# Altium footprint library th.PcbLib: 51 footprints (part 1 of 4)
Each footprint in its own frame and in the unit in brackets; x right, y up, seen from the top. Pads: shape width x height; smd on the part's side, far side on the other; paste and mask are expansions set on the pad; w line width, h text height; cw(c..) or ccw(c..) is an arc to the next point about the centre after c.
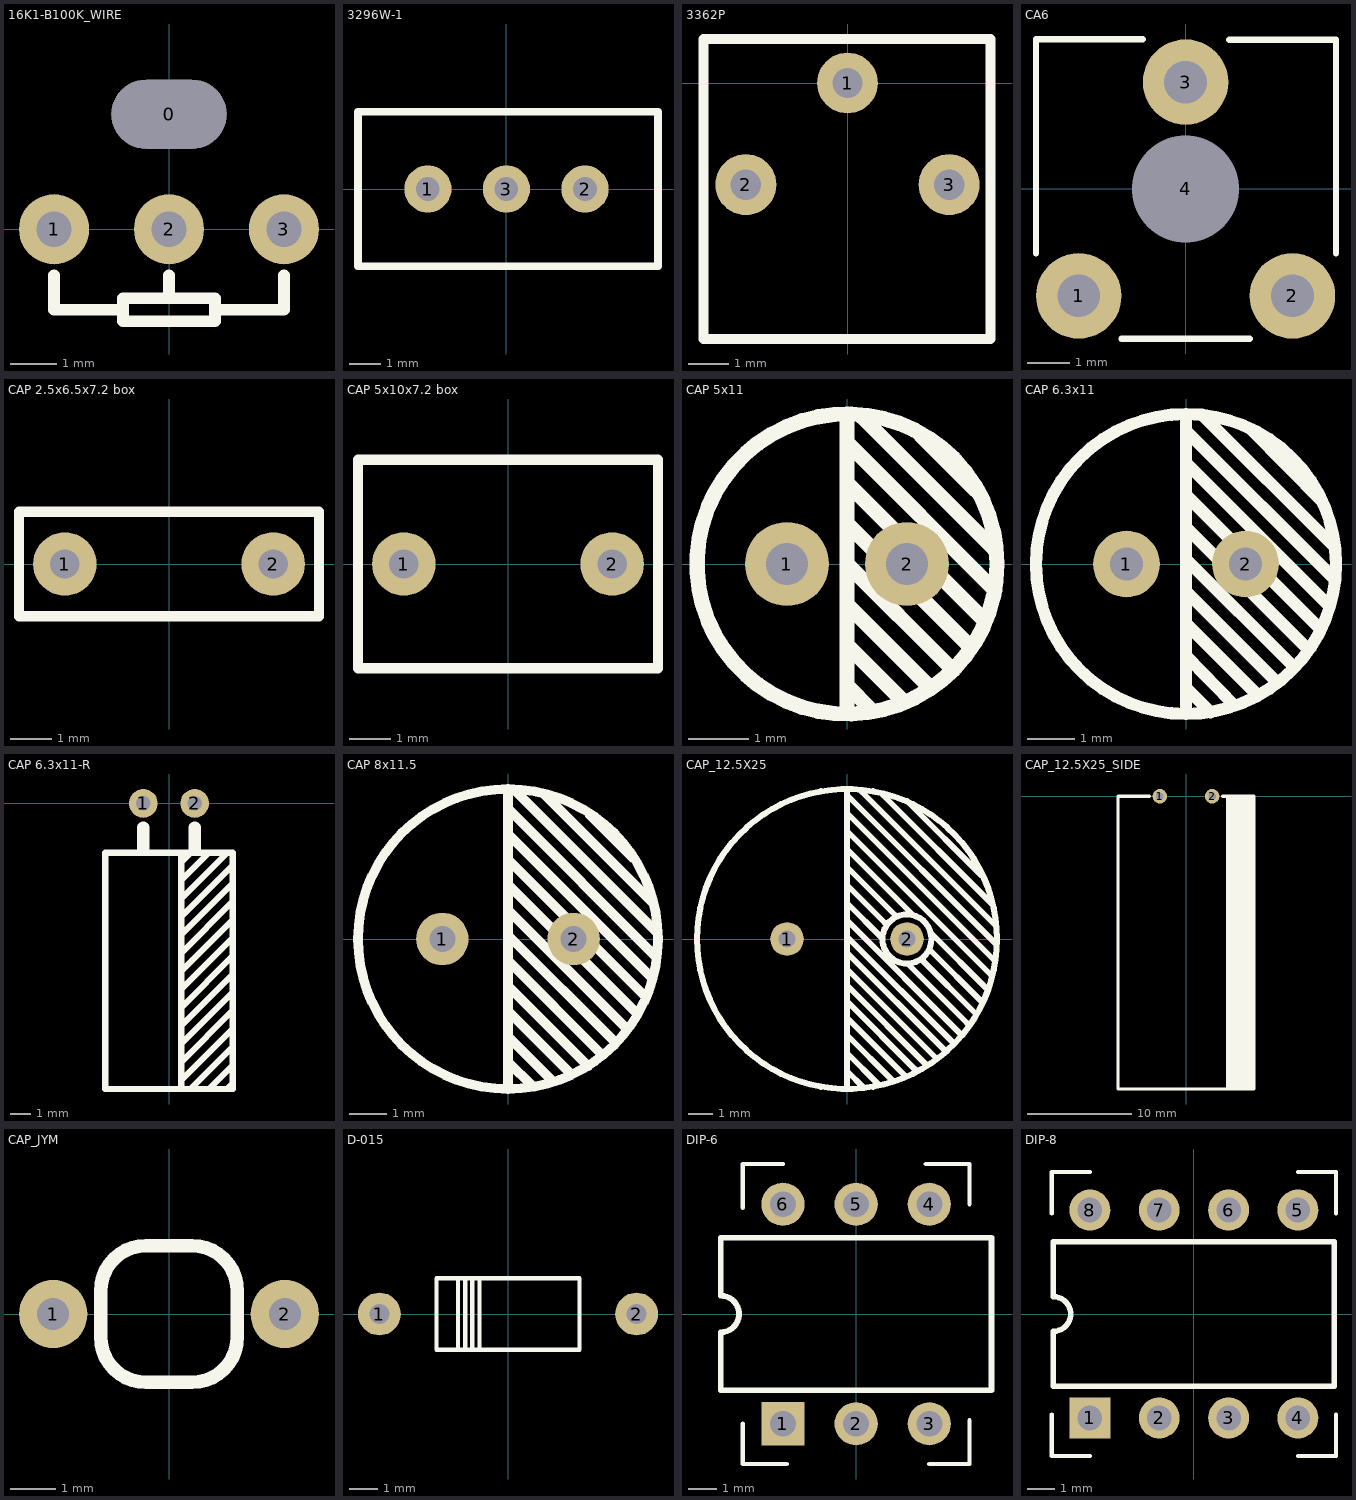
[diagram p0: the footprints below, top view; thin cyan lines are the x and y axes]

## 16K1-B100K_WIRE [mil]
pads (4):
  oval 98.43x59.06 hole 59.06 slot 98.43 at 0 deg: 0(0,98.43)
  round 60 hole 30: 1(-98.43,0) 2(0,0) 3(98.43,0)
Top Overlay:
  lines w10: -98.43,-39.37 -98.43,-68.9 -39.37,-68.9 ; 0,-59.06 0,-39.37 ; 39.37,-68.9 98.43,-68.9 98.43,-39.37 ; -39.37,-78.74 -39.37,-59.06 39.37,-59.06 39.37,-78.74 -39.37,-78.74

## 3296W-1 [mil] "Подстроечный резистор"
pads (3):
  round 60 hole 30: 1(-100,0) 2(100,0) 3(0,0)
Top Overlay:
  lines w10: -188.98,-98.43 192.91,-98.43 192.91,98.43 -188.98,98.43 -188.98,-98.43
3D body "3296W-1.STEP": height 453.54, standoff -157.48, extent -187.6,-94.88 187.6,95.28

## 3362P [mil]
pads (3):
  round 60 hole 30: 1(0,0) 2(-100,-100) 3(100,-100)
Top Overlay:
  lines w9.84: -141.73,-251.97 140.75,-251.97 140.75,43.31 -141.73,43.31 -141.73,-251.97
3D body "3362P.STEP": height 185.04, standoff -67.67, extent -129.91,-240.74 129.93,34.45

## CA6 [mm]
pads (4):
  round 2 hole 1: 1(-2.5,-2.5) 2(2.5,-2.5) 3(0,2.5)
  round 1.524 hole 2.5: 4(0,0)
Top Overlay:
  lines w0.15: -3.5,-1.5 -3.5,3.5 -1,3.5 ; -1.5,-3.5 1.5,-3.5 ; 1.018,3.496 3.518,3.496 3.518,-1.504
3D body "CA6.STEP": height 4.06, standoff -4.87, extent -3.25,-3.65 3.25,3.25

## CAP 2.5x6.5x7.2 box [mm]
pads (2):
  round 1.524 hole 0.7: 1(-2.5,0) 2(2.5,0)
Top Overlay:
  lines w0.25: -3.6,-1.25 -3.6,1.25 3.6,1.25 3.6,-1.25 -3.6,-1.25
Mechanical 15:
  lines w0.05: -3.6,-1.25 -3.6,1.25 3.6,1.25 3.6,-1.25 -3.6,-1.25
3D body "Cap2.5x7.2x6.5.STEP": height 6.5, standoff -2, extent -3.6,-1.25 3.6,1.25

## CAP 5x10x7.2 box [mm]
pads (2):
  round 1.524 hole 0.7: 1(-2.5,0) 2(2.5,0)
Top Overlay:
  lines w0.25: -3.6,-2.5 3.6,-2.5 3.6,2.5 -3.6,2.5 -3.6,-2.5
Mechanical 15:
  lines w0.05: -3.6,-2.5 3.6,-2.5 3.6,2.5 -3.6,2.5 -3.6,-2.5
3D body "Cap5x7.2x10.STEP": height 10, standoff -2, extent -3.6,-2.5 3.6,2.5

## CAP 5x11 [mm]
pads (2):
  round 1.4 hole 0.7: 1(-1,0) 2(1,0)
Top Overlay:
  circle w0.254: c0,0 r2.5
  lines w0.254: 0,-2.475 0,2.5 ; 0,-2.025 0.413,-2.438 ; 0,-1.35 0.925,-2.275 ; 0,-0.675 1.4,-2.075 ; 0,0 1.737,-1.737 ; 0,0.675 2.05,-1.375 ; 0,1.35 2.3,-0.95 ; 0,2.025 2.462,-0.437 ; 0.238,2.462 2.462,0.238 ; 1.225,2.15 2.15,1.225
3D body "UFG_5x11.STEP": height 11.56, standoff -1.84, extent -2.5,-2.525 2.5,2.475

## CAP 6.3x11 [mm]
pads (2):
  round 1.4 hole 0.7: 1(-1.25,0) 2(1.25,0)
Top Overlay:
  circle w0.254: c0,0 r3.15
  lines w0.254: 0,-3.15 0,3.15 ; 0,-2.6 0.513,-3.113 ; 0,-1.925 1.025,-2.975 ; 0,-1.25 1.512,-2.762 ; 0,-0.575 1.9,-2.475 ; 0,0.1 2.25,-2.15 ; 0,0.775 2.538,-1.763 ; 0,1.45 2.813,-1.363 ; 0,2.125 3.013,-0.888 ; 0,2.8 3.137,-0.337 ; 0.337,3.137 3.113,0.362 ; 1.375,2.825 2.86,1.311
3D body "UFG_6.3x11.STEP": height 12.06, standoff -1.84, extent -3.15,-3.15 3.15,3.15

## CAP 6.3x11-R [mm]
pads (2):
  round 1.4 hole 0.7: 1(-1.25,0) 2(1.25,0)
Top Overlay:
  lines w0.3: 0.6,-13.9 0.6,-2.4 ; 0.6,-13.477 3.088,-10.988 ; 0.6,-12.592 3.088,-10.104 ; 0.6,-11.707 3.088,-9.219 ; 0.6,-10.823 3.088,-8.334 ; 0.6,-9.938 3.088,-7.45 ; 0.6,-9.054 3.088,-6.565 ; 0.6,-8.169 3.088,-5.681 ; 0.6,-7.284 3.088,-4.796 ; 0.6,-6.4 3.088,-3.911 ; 0.6,-5.515 3.088,-3.027 ; 0.6,-4.63 2.832,-2.398 ; 0.6,-3.746 1.946,-2.4 ; 0.6,-2.861 1.043,-2.418 ; 1.068,-13.893 3.088,-11.873 ; 1.948,-13.898 3.088,-12.758 ; 2.84,-13.89 3.088,-13.642 ; -3.1,-13.9 3.1,-13.9 3.1,-2.4 -3.1,-2.4 -3.1,-13.9
  lines w0.6: -1.25,-2.225 -1.25,-1.175 ; 1.25,-2.225 1.25,-1.175
3D body "UFG_6.3x11-R.STEP": height 6.35, standoff -0.8, extent -3.15,-13.909 3.15,0.292

## CAP 8x11.5 [mm]
pads (2):
  round 1.4 hole 0.7: 1(-1.75,0) 2(1.75,0)
Top Overlay:
  circle w0.254: c0,0 r4
  lines w0.254: 0,-3.95 0,3.95 ; 0,-3.275 0.663,-3.938 ; 0,-2.6 1.2,-3.8 ; 0,-1.925 1.675,-3.6 ; 0,-1.25 2.138,-3.388 ; 0,-0.575 2.525,-3.1 ; 0,0.1 2.862,-2.762 ; 0,0.775 3.15,-2.375 ; 0,1.45 3.437,-1.987 ; 0,2.125 3.688,-1.563 ; 0,2.8 3.85,-1.05 ; 0,3.475 3.95,-0.475 ; 0.2,3.95 3.95,0.2 ; 0.95,3.875 3.875,0.95 ; 2.15,3.35 3.362,2.138
3D body "UFG_8x11.5.STEP": height 12.06, standoff -1.84, extent -4,-4 4,4

## CAP_12.5X25 [mm]
pads (2):
  round 1.4 hole 0.7: 1(-2.5,0) 2(2.5,0)
Top Overlay:
  circle w0.254: c2.5,0 r1.023
  circle w0.254: c0,0 r6.25
  lines w0.254: 0,-6.25 0,6.25 ; 0,-5.5 0.7,-6.2 ; 0,-4.75 1.275,-6.025 ; 0,-4 1.887,-5.887 ; 0,-3.275 2.412,-5.687 ; 0,-2.6 2.825,-5.425 ; 0,-1.925 3.288,-5.213 ; 0,-1.25 3.75,-5 ; 0,-0.575 4.088,-4.663 ; 0,0.1 4.425,-4.325 ; 0,0.775 4.763,-3.988 ; 0,1.5 1.462,0.038 ; 0,2.25 1.562,0.688 ; 0,3 2,1 ; 0,3.75 2.75,1 ; 0,4.5 6,-1.5 ; 0,5.25 6.125,-0.875 ; 0,6 6.175,-0.175 ; 0.625,6.125 6.188,0.563 ; 1.5,6 6.037,1.463 ; 2.5,5.75 5.613,2.638 ; 2.562,-1.062 5,-3.5 ; 3.087,-0.837 5.375,-3.125 ; 3.437,-0.437 5.65,-2.65 ; 3.5,0.25 5.863,-2.113
3D body "User Library-Cap-EL(12_5x25-5)T.step": height 25.7, standoff -3.3, extent -6.25,-6.25 6.252,6.25

## CAP_12.5X25_SIDE [mm]
pads (2):
  round 1.4 hole 0.7: 1(-2.5,0) 2(2.5,0)
Top Overlay:
  rectangle: 4,-28 6.5,0
  lines w0.3: -3.5,0 -6.5,0 -6.5,-28 6.5,-28 6.5,0 3.5,0 ; 4,-28 4,0
3D body "User Library-Cap-EL(12_5x25-5)T.step": height 12.48, standoff -0.02, extent -6.25,-28.002 6.252,1

## CAP_JYM [mm]
pads (2):
  round 1.5 hole 0.7: 1(-2.54,0) 2(2.54,0)
Top Overlay:
  lines w0.3: -1.5,-0.5 ccw(c-0.5,-0.5) -0.5,-1.5 0.5,-1.5 ccw(c0.5,-0.5) 1.5,-0.5 1.5,0.5 ccw(c0.5,0.5) 0.5,1.5 -0.5,1.5 ccw(c-0.5,0.5) -1.5,0.5 -1.5,-0.5
3D body "JYM_C1.STEP": height 6.78, standoff -1.66, extent -2.79,-1.5 2.79,1.5

## D-015 [mm]
pads (2):
  round 1.5 hole 0.7: 1(-4.5,0) 2(4.5,0)
Top Overlay:
  lines w0.15: -1.75,-1.25 -1.75,1.25 ; -1.5,-1.25 -1.5,1.25 ; -1.25,-1.25 -1.25,1.25 ; -1,-1.25 -1,1.25 ; -2.5,-1.25 -2.5,1.25 2.5,1.25 2.5,-1.25 -2.5,-1.25
3D body "diode.STEP": height 2.79, standoff -3, extent -4.75,-1.3 4.75,1.3

## DIP-6 [mm]
pads (6):
  rect 1.5x1.5 hole 0.9: 1(-2.54,-3.81)
  round 1.5 hole 0.9: 2(0,-3.81) 3(2.54,-3.81) 4(2.54,3.81) 5(0,3.81) 6(-2.54,3.81)
Top Overlay:
  lines w0.15: -3.937,-3.81 -3.937,-5.207 -2.413,-5.207 ; -3.937,3.683 -3.937,5.207 -2.54,5.207 ; 2.413,5.207 3.937,5.207 3.937,3.81 ; 2.54,-5.207 3.937,-5.207 3.937,-3.683
  lines w0.2: -4.7,-2.65 4.7,-2.65 4.7,2.65 -4.7,2.65 -4.7,0.635 cw(c-4.7,0) -4.7,-0.635 -4.7,-2.65
3D body "User Library-DIP6.STEP": height 8.09, standoff 0.79, extent -3.556,-3.935 3.564,3.935
3D body "DIP6_SOC.step": height 5.33, standoff -2.67, extent -3.81,-5.08 3.81,5.08

## DIP-8 [mm]
pads (8):
  rect 1.5x1.5 hole 0.9: 1(-3.81,-3.81)
  round 1.5 hole 0.9: 2(-1.27,-3.81) 3(1.27,-3.81) 4(3.81,-3.81) 5(3.81,3.81) 6(1.27,3.81) 7(-1.27,3.81) 8(-3.81,3.81)
Top Overlay:
  lines w0.15: -5.207,-3.683 -5.207,-5.207 -3.81,-5.207 ; -5.207,3.683 -5.207,5.207 -3.81,5.207 ; 3.81,-5.207 5.207,-5.207 5.207,-3.683 ; 3.81,5.207 5.207,5.207 5.207,3.683
  lines w0.2: -5.15,-2.65 -5.15,-0.635 ccw(c-5.15,0) -5.15,0.635 -5.15,2.65 5.15,2.65 5.15,-2.65 -5.15,-2.65
3D body "User Library-DIP8test.STEP": height 8.57, standoff 0.19, extent -4.955,-3.91 4.955,3.91
3D body "DIP8SOC.STEP": height 5.1, standoff -2.9, extent -5.08,-5.08 5.08,5.08